# Altium footprint library CPD.PcbLib: 58 footprints (part 2 of 4)
Each footprint in its own frame and in the unit in brackets; x right, y up, seen from the top. Pads: shape width x height; smd on the part's side, far side on the other; paste and mask are expansions set on the pad; w line width, h text height; cw(c..) or ccw(c..) is an arc to the next point about the centre after c.
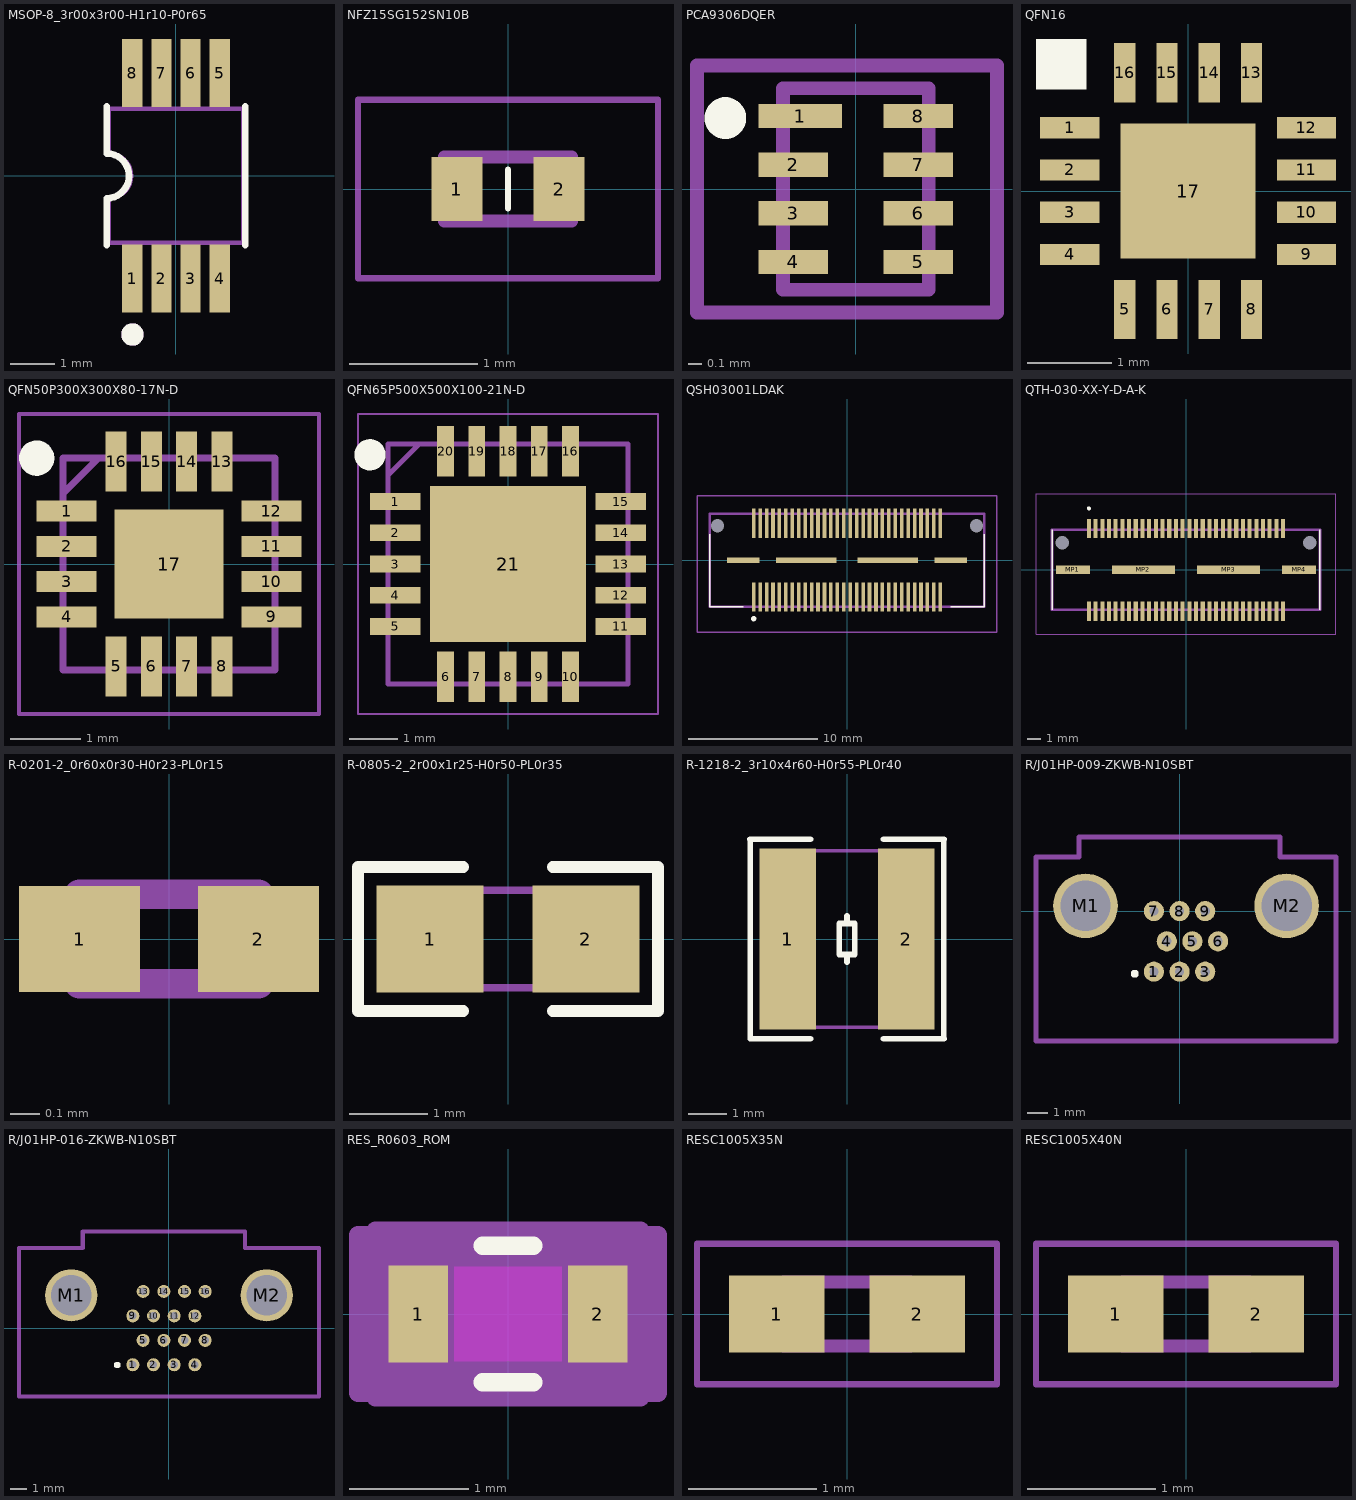
[diagram p1: the footprints below, top view; thin cyan lines are the x and y axes]

## MSOP-8_3r00x3r00-H1r10-P0r65 [mm]
height 1.1
pads (8):
  rect 0.457x1.524 smd paste+0 mask+0.05: 1(-0.975,-2.3) 2(-0.325,-2.3) 3(0.325,-2.3) 4(0.975,-2.3) 5(0.975,2.3) 6(0.325,2.3) 7(-0.325,2.3) 8(-0.975,2.3)
Top Overlay:
  circle w0.3: c-0.975,-3.55 r0.1
  lines w0.152: -1.55,-1.55 -1.55,-0.5 ccw(c-1.55,0) -1.55,0.5 -1.55,1.55 ; 1.55,-1.55 1.55,1.55
Mechanical 13:
  circle w0.3: c-0.975,-3.55 r0.1
  lines w0.1: -1.5,-1.5 1.5,-1.5 1.5,1.5 -1.5,1.5 -1.5,0.5 cw(c-1.5,0) -1.5,-0.5 -1.5,-1.5
3D body "MSOP-8_3r00x3r00-H1r10-P0r65-LS4r90-PL0r55-PW0r32-G0r10.step": height 1.1, standoff 0, extent -1.5,-2.45 1.5,2.45

## NFZ15SG152SN10B [mm]
pads (2):
  rect 0.4x0.5 smd: 1(-0.4,0) 2(0.4,0)
Top Overlay:
  lines w0.05: 0,-0.15 0,0.15
Mechanical 13:
  lines w0.1: -0.5,-0.25 0.5,-0.25 0.5,0.25 -0.5,0.25 -0.5,-0.25
Mechanical 15:
  lines w0.05: -1.175,-0.7 1.175,-0.7 1.175,0.7 -1.175,0.7 -1.175,-0.7
3D body "BLM15AX121SN1D.stp": height 0.5, standoff 0, extent -0.5,-0.25 0.5,0.25

## PCA9306DQER [mm]
pads (8):
  rect 0.6x0.175 smd: 1(-0.4,0.525)
  rect 0.5x0.175 smd: 2(-0.45,0.175) 3(-0.45,-0.175) 4(-0.45,-0.525) 5(0.45,-0.525) 6(0.45,-0.175) 7(0.45,0.175) 8(0.45,0.525)
Top Overlay:
  lines w0.2: -0.889,0.508 cw(c-0.939,0.511) -0.989,0.511 ; -0.989,0.511 ccw(c-0.939,0.511) -0.889,0.511 ccw(c-0.939,0.511) -0.989,0.511
Mechanical 13:
  lines w0.1: -0.525,-0.725 0.525,-0.725 0.525,0.725 -0.525,0.725 -0.525,-0.725
Mechanical 15:
  lines w0.1: -1.143,-0.889 1.016,-0.889 1.016,0.889 -1.143,0.889 -1.143,-0.889
3D body "PCA9306DQER.stp": height 0.4, standoff 0, extent -0.5,-0.7 0.5,0.7

## QFN16 [mm]
pads (17):
  rect 0.7x0.25 smd: 1(-1.4,0.75) 2(-1.4,0.25) 3(-1.4,-0.25) 4(-1.4,-0.75) 9(1.4,-0.75) 10(1.4,-0.25) 11(1.4,0.25) 12(1.4,0.75)
  rect 0.25x0.7 smd: 5(-0.75,-1.4) 6(-0.25,-1.4) 7(0.25,-1.4) 8(0.75,-1.4) 13(0.75,1.4) 14(0.25,1.4) 15(-0.25,1.4) 16(-0.75,1.4)
  rect 1.6x1.6 smd: 17(0,0)
Top Overlay:
  rectangle: -1.8,1.2 -1.2,1.8
3D body "User Library-QFN-16.STEP": height 0.9, standoff 0, extent -1.502,-1.501 1.5,1.501

## QFN50P300X300X80-17N-D [mm]
pads (17):
  rect 0.85x0.3 smd: 1(-1.45,0.75) 2(-1.45,0.25) 3(-1.45,-0.25) 4(-1.45,-0.75) 9(1.45,-0.75) 10(1.45,-0.25) 11(1.45,0.25) 12(1.45,0.75)
  rect 0.3x0.85 smd: 5(-0.75,-1.45) 6(-0.25,-1.45) 7(0.25,-1.45) 8(0.75,-1.45) 13(0.75,1.45) 14(0.25,1.45) 15(-0.25,1.45) 16(-0.75,1.45)
  rect 1.55x1.55 smd: 17(0,0)
Top Overlay:
  circle w0.25: c-1.875,1.5 r0.125
Mechanical 13:
  lines w0.1: -1.5,1 -1,1.5 ; -1.5,-1.5 -1.5,1.5 1.5,1.5 1.5,-1.5 -1.5,-1.5
Mechanical 15:
  lines w0.05: -2.125,-2.125 -2.125,2.125 2.125,2.125 2.125,-2.125 -2.125,-2.125
3D body "LT3482IUD#TRPBF.stp": height 0.75, standoff 0, extent -1.5,-1.5 1.5,1.5

## QFN65P500X500X100-21N-D [mm]
pads (21):
  rect 1.05x0.35 smd: 1(-2.35,1.3) 2(-2.35,0.65) 3(-2.35,0) 4(-2.35,-0.65) 5(-2.35,-1.3) 11(2.35,-1.3) 12(2.35,-0.65) 13(2.35,0) 14(2.35,0.65) 15(2.35,1.3)
  rect 0.35x1.05 smd: 6(-1.3,-2.35) 7(-0.65,-2.35) 8(0,-2.35) 9(0.65,-2.35) 10(1.3,-2.35) 16(1.3,2.35) 17(0.65,2.35) 18(0,2.35) 19(-0.65,2.35) 20(-1.3,2.35)
  rect 3.25x3.25 smd: 21(0,0)
Top Overlay:
  circle w0.325: c-2.875,2.275 r0.162
Mechanical 13:
  lines w0.1: -2.5,1.85 -1.85,2.5 ; -2.5,-2.5 2.5,-2.5 2.5,2.5 -2.5,2.5 -2.5,-2.5
Mechanical 15:
  lines w0.05: -3.125,-3.125 3.125,-3.125 3.125,3.125 -3.125,3.125 -3.125,-3.125
3D body "TPS7A4701RGWR.stp": height 1, standoff 0, extent -2.5,-2.5 2.5,2.5

## QSH03001LDAK [mm]
pads (66):
  rect 0.279x2.27 smd: 1(-7.25,-2.865) 2(-7.25,2.865) 3(-6.75,-2.865) 4(-6.75,2.865) 5(-6.25,-2.865) 6(-6.25,2.865) 7(-5.75,-2.865) 8(-5.75,2.865) 9(-5.25,-2.865) 10(-5.25,2.865) 11(-4.75,-2.865) 12(-4.75,2.865) 13(-4.25,-2.865) 14(-4.25,2.865) 15(-3.75,-2.865) 16(-3.75,2.865) 17(-3.25,-2.865) 18(-3.25,2.865) 19(-2.75,-2.865) 20(-2.75,2.865) 21(-2.25,-2.865) 22(-2.25,2.865) 23(-1.75,-2.865) 24(-1.75,2.865) 25(-1.25,-2.865) 26(-1.25,2.865) 27(-0.75,-2.865) 28(-0.75,2.865) 29(-0.25,-2.865) 30(-0.25,2.865) 31(0.25,-2.865) 32(0.25,2.865) 33(0.75,-2.865) 34(0.75,2.865) 35(1.25,-2.865) 36(1.25,2.865) 37(1.75,-2.865) 38(1.75,2.865) 39(2.25,-2.865) 40(2.25,2.865) 41(2.75,-2.865) 42(2.75,2.865) 43(3.25,-2.865) 44(3.25,2.865) 45(3.75,-2.865) 46(3.75,2.865) 47(4.25,-2.865) 48(4.25,2.865) 49(4.75,-2.865) 50(4.75,2.865) 51(5.25,-2.865) 52(5.25,2.865) 53(5.75,-2.865) 54(5.75,2.865) 55(6.25,-2.865) 56(6.25,2.865) 57(6.75,-2.865) 58(6.75,2.865) 59(7.25,-2.865) 60(7.25,2.865)
  round 0.51 hole 1.02 unplated: MH1(-10.065,2.67) MH2(10.065,2.67)
  rect 2.54x0.43 smd: MP1(-8.065,0) MP2(8.065,0)
  rect 4.7x0.43 smd: MP3(-3.175,0) MP4(3.175,0)
Top Overlay:
  lines w0.1: -10.655,2 -10.655,-3.62 -8.065,-3.62 ; 8.065,-3.62 10.655,-3.62 10.655,2
  lines w0.3: -7.25,-4.6 cw(c-7.25,-4.55) -7.25,-4.5 cw(c-7.25,-4.55) -7.25,-4.6
Mechanical 13:
  lines w0.2: -10.655,-3.62 10.655,-3.62 10.655,3.62 -10.655,3.62 -10.655,-3.62
Mechanical 15:
  lines w0.1: -11.655,-5.6 11.655,-5.6 11.655,5 -11.655,5 -11.655,-5.6
3D body "QSH-030-01-L-D-A--3DModel-STEP-56544.STEP": height 3.25, standoff -0.75, extent -10.668,-3.683 10.602,3.811

## QTH-030-XX-Y-D-A-K [mm]
pads (66):
  rect 0.305x1.45 smd: 1(-7.25,3.086) 2(-7.25,-3.086) 3(-6.75,3.086) 4(-6.75,-3.086) 5(-6.25,3.086) 6(-6.25,-3.086) 7(-5.75,3.086) 8(-5.75,-3.086) 9(-5.25,3.086) 10(-5.25,-3.086) 11(-4.75,3.086) 12(-4.75,-3.086) 13(-4.25,3.086) 14(-4.25,-3.086) 15(-3.75,3.086) 16(-3.75,-3.086) 17(-3.25,3.086) 18(-3.25,-3.086) 19(-2.75,3.086) 20(-2.75,-3.086) 21(-2.25,3.086) 22(-2.25,-3.086) 23(-1.75,3.086) 24(-1.75,-3.086) 25(-1.25,3.086) 26(-1.25,-3.086) 27(-0.75,3.086) 28(-0.75,-3.086) 29(-0.25,3.086) 30(-0.25,-3.086) 31(0.25,3.086) 32(0.25,-3.086) 33(0.75,3.086) 34(0.75,-3.086) 35(1.25,3.086) 36(1.25,-3.086) 37(1.75,3.086) 38(1.75,-3.086) 39(2.25,3.086) 40(2.25,-3.086) 41(2.75,3.086) 42(2.75,-3.086) 43(3.25,3.086) 44(3.25,-3.086) 45(3.75,3.086) 46(3.75,-3.086) 47(4.25,3.086) 48(4.25,-3.086) 49(4.75,3.086) 50(4.75,-3.086) 51(5.25,3.086) 52(5.25,-3.086) 53(5.75,3.086) 54(5.75,-3.086) 55(6.25,3.086) 56(6.25,-3.086) 57(6.75,3.086) 58(6.75,-3.086) 59(7.25,3.086) 60(7.25,-3.086)
  round 0.51 hole 1.02 unplated: 65(-9.239,2.036) 66(9.239,2.036)
  rect 2.54x0.64 smd: MP1(-8.443,0) MP4(8.443,0)
  rect 4.7x0.64 smd: MP2(-3.174,0) MP3(3.174,0)
Top Overlay:
  circle w0.2: c-7.25,4.586 r0.05
  lines w0.1: -10,-2.985 -10,2.985 ; 10,-2.985 10,2.985
Mechanical 13:
  lines w0.2: -10,-2.985 -10,2.985 10,2.985 10,-2.985 -10,-2.985
Mechanical 15:
  lines w0.05: -11.2,-4.811 -11.2,5.686 11.2,5.686 11.2,-4.811 -11.2,-4.811
3D body "QTH-030-01-F-D-A-K.stp": height 4.19, standoff -0.84, extent -10.001,-3.683 10.001,3.429

## R-0201-2_0r60x0r30-H0r23-PL0r15 [mil]
height 10.24
pads (2):
  rect 16x14 smd paste+0 mask+1.97: 1(-11.81,0) 2(11.81,0)
Mechanical 13:
  lines w3.94: -11.81,-5.91 11.81,-5.91 11.81,5.91 -11.81,5.91 -11.81,-5.91
3D body: height 10, standoff 0, extent -12.8,-6.89 12.8,6.89

## R-0805-2_2r00x1r25-H0r50-PL0r35 [mm]
height 0.6
pads (2):
  rect 1.372x1.372 smd paste+0 mask+0.076: 1(-1,0) 2(1,0)
Top Overlay:
  lines w0.152: -0.575,-0.925 -1.925,-0.925 -1.925,0.925 -0.575,0.925 ; 0.575,-0.925 1.925,-0.925 1.925,0.925 0.575,0.925
Mechanical 13:
  lines w0.1: -1,-0.625 -1,0.625 1,0.625 1,-0.625 -1,-0.625
3D body "R-0805-2_2r00x1r25-H0r50-PL0r35.step": height 0.5, standoff 0, extent -1,-0.752 1,0.498

## R-1218-2_3r10x4r60-H0r55-PL0r40 [mm]
height 0.65
pads (2):
  rect 1.473x4.724 smd paste+0 mask+0.076: 1(-1.55,0) 2(1.55,0)
Top Overlay:
  lines w0.152: -2.526,2.6 -0.95,2.6 ; -2.525,-2.6 -2.525,2.6 ; -2.524,-2.6 -0.95,-2.6 ; 0,-0.6 0,-0.4 ; 0,0.4 0,0.6 ; 0.95,-2.6 2.526,-2.6 ; 0.95,2.6 2.526,2.6 ; 2.525,-2.6 2.525,2.6 ; -0.2,-0.4 -0.2,0.4 0.2,0.4 0.2,-0.4 -0.2,-0.4
Mechanical 13:
  lines w0.1: -1.55,-2.3 -1.55,2.3 1.55,2.3 1.55,-2.3 -1.55,-2.3
  text "R-1218-2_3r10x4r60-H0r55-PL0r40" at -7.703,-6.23 h1
3D body "R-1218-2_3r10x4r60-H0r55-PL0r40.step": height 0.55, standoff 0, extent -1.55,-2.3 1.55,2.3

## R/J01HP-009-ZKWB-N10SBT [mm]
pads (11):
  round 1 hole 0.46: 1(-1.27,-3) 2(0,-3) 3(1.27,-3) 4(-0.635,-1.5) 5(0.635,-1.5) 6(1.905,-1.5) 7(-1.27,0) 8(0,0) 9(1.27,0)
  round 3.2 hole 2.5: M1(-4.66,0.26) M2(5.3,0.26)
Top Overlay:
  lines w0.254: -2.286,-3.175 -2.159,-3.175 -2.159,-3.048 -2.286,-3.048 -2.286,-3.175
Mechanical 1:
  lines w0.254: -7.112,-6.44 -7.112,2.67 -4.98,2.67 -4.98,3.67 4.98,3.67 4.98,2.67 7.747,2.67 7.747,-6.44 -7.112,-6.44
3D body "RJ01HP-009-ZKWB-N10SBT-9.stp": height 8.79, standoff -3.54, extent -7.821,-13.84 8.329,3.52

## R/J01HP-016-ZKWB-N10SBT [mm]
pads (18):
  round 0.8 hole 0.46: 1(-2.22,-2.25) 2(-0.95,-2.25) 3(0.32,-2.25) 4(1.59,-2.25) 5(-1.585,-0.75) 6(-0.315,-0.75) 7(0.955,-0.75) 8(2.225,-0.75) 9(-2.22,0.75) 10(-0.95,0.75) 11(0.32,0.75) 12(1.59,0.75) 13(-1.585,2.25) 14(-0.315,2.25) 15(0.955,2.25) 16(2.225,2.25)
  round 3.2 hole 2.5: M1(-6,2.01) M2(6,2.01)
Top Overlay:
  lines w0.254: -3.236,-2.322 -3.236,-2.195 -3.109,-2.195 -3.109,-2.322 -3.236,-2.322
Mechanical 1:
  lines w0.254: -9.205,-2.668 -9.203,-2.67 -9.203,-4.19 9.21,-4.19 9.21,4.92 4.665,4.92 4.665,5.92 -5.295,5.92 -5.295,4.92 -9.205,4.92 -9.205,4.166 -9.205,-0.389 -9.205,-2.668
3D body "RJ01HP-016-ZKWB-N10SBT.STEP": height 9.27, standoff -3.72, extent -9.205,-12.018 9.295,5.342

## RES_R0603_ROM [mm]
pads (2):
  rect 0.5x0.813 smd paste+0 mask+0: 1(-0.75,0) 2(0.75,0)
Top Layer keep-out:
  region: -0.449,-0.394 -0.449,0.394 0.449,0.394 0.449,-0.394
Top Overlay:
  lines w0.152: -0.211,-0.572 0.211,-0.572 ; -0.211,0.572 0.211,0.572
Mechanical 13:
  lines w0.025: -0.851,-0.445 -0.851,0.445 0.851,0.445 0.851,-0.445 -0.851,-0.445
Mechanical 15:
  region: -1.105,-0.66 -1.254,-0.66 -1.254,0.66 -1.105,0.66 -1.105,0.699 1.105,0.699 1.105,0.66 1.254,0.66 1.254,-0.66 1.105,-0.66 1.105,-0.699 -1.105,-0.699
  lines w0.152: -1.254,-0.66 -1.105,-0.66 -1.105,-0.699 1.105,-0.699 1.105,-0.66 1.254,-0.66 1.254,0.66 1.105,0.66 1.105,0.699 -1.105,0.699 -1.105,0.66 -1.254,0.66 -1.254,-0.66
3D body "RES_R0603_ROM.step": height 0.56, standoff 0, extent -0.851,-0.444 0.851,0.444

## RESC1005X35N [mm]
pads (2):
  rect 0.75x0.6 smd: 1(-0.55,0) 2(0.55,0)
Mechanical 13:
  lines w0.1: -0.5,-0.25 -0.5,0.25 0.5,0.25 0.5,-0.25 -0.5,-0.25
Mechanical 15:
  lines w0.05: -1.175,-0.55 -1.175,0.55 1.175,0.55 1.175,-0.55 -1.175,-0.55
3D body "RT0402BRD07100RL.stp": height 0.35, standoff 0, extent -0.5,-0.25 0.5,0.25

## RESC1005X40N [mm]
pads (2):
  rect 0.75x0.6 smd: 1(-0.55,0) 2(0.55,0)
Mechanical 13:
  lines w0.1: -0.5,-0.25 -0.5,0.25 0.5,0.25 0.5,-0.25 -0.5,-0.25
Mechanical 15:
  lines w0.05: -1.175,-0.55 -1.175,0.55 1.175,0.55 1.175,-0.55 -1.175,-0.55
3D body "RC0402FR-070RL.stp": height 0.4, standoff 0, extent -0.5,-0.25 0.5,0.25